# Altium footprint library Vowstar_Basic_Device.PcbLib: 170 footprints (part 6 of 11)
Each footprint in its own frame and in the unit in brackets; x right, y up, seen from the top. Pads: shape width x height; smd on the part's side, far side on the other; paste and mask are expansions set on the pad; w line width, h text height; cw(c..) or ccw(c..) is an arc to the next point about the centre after c.
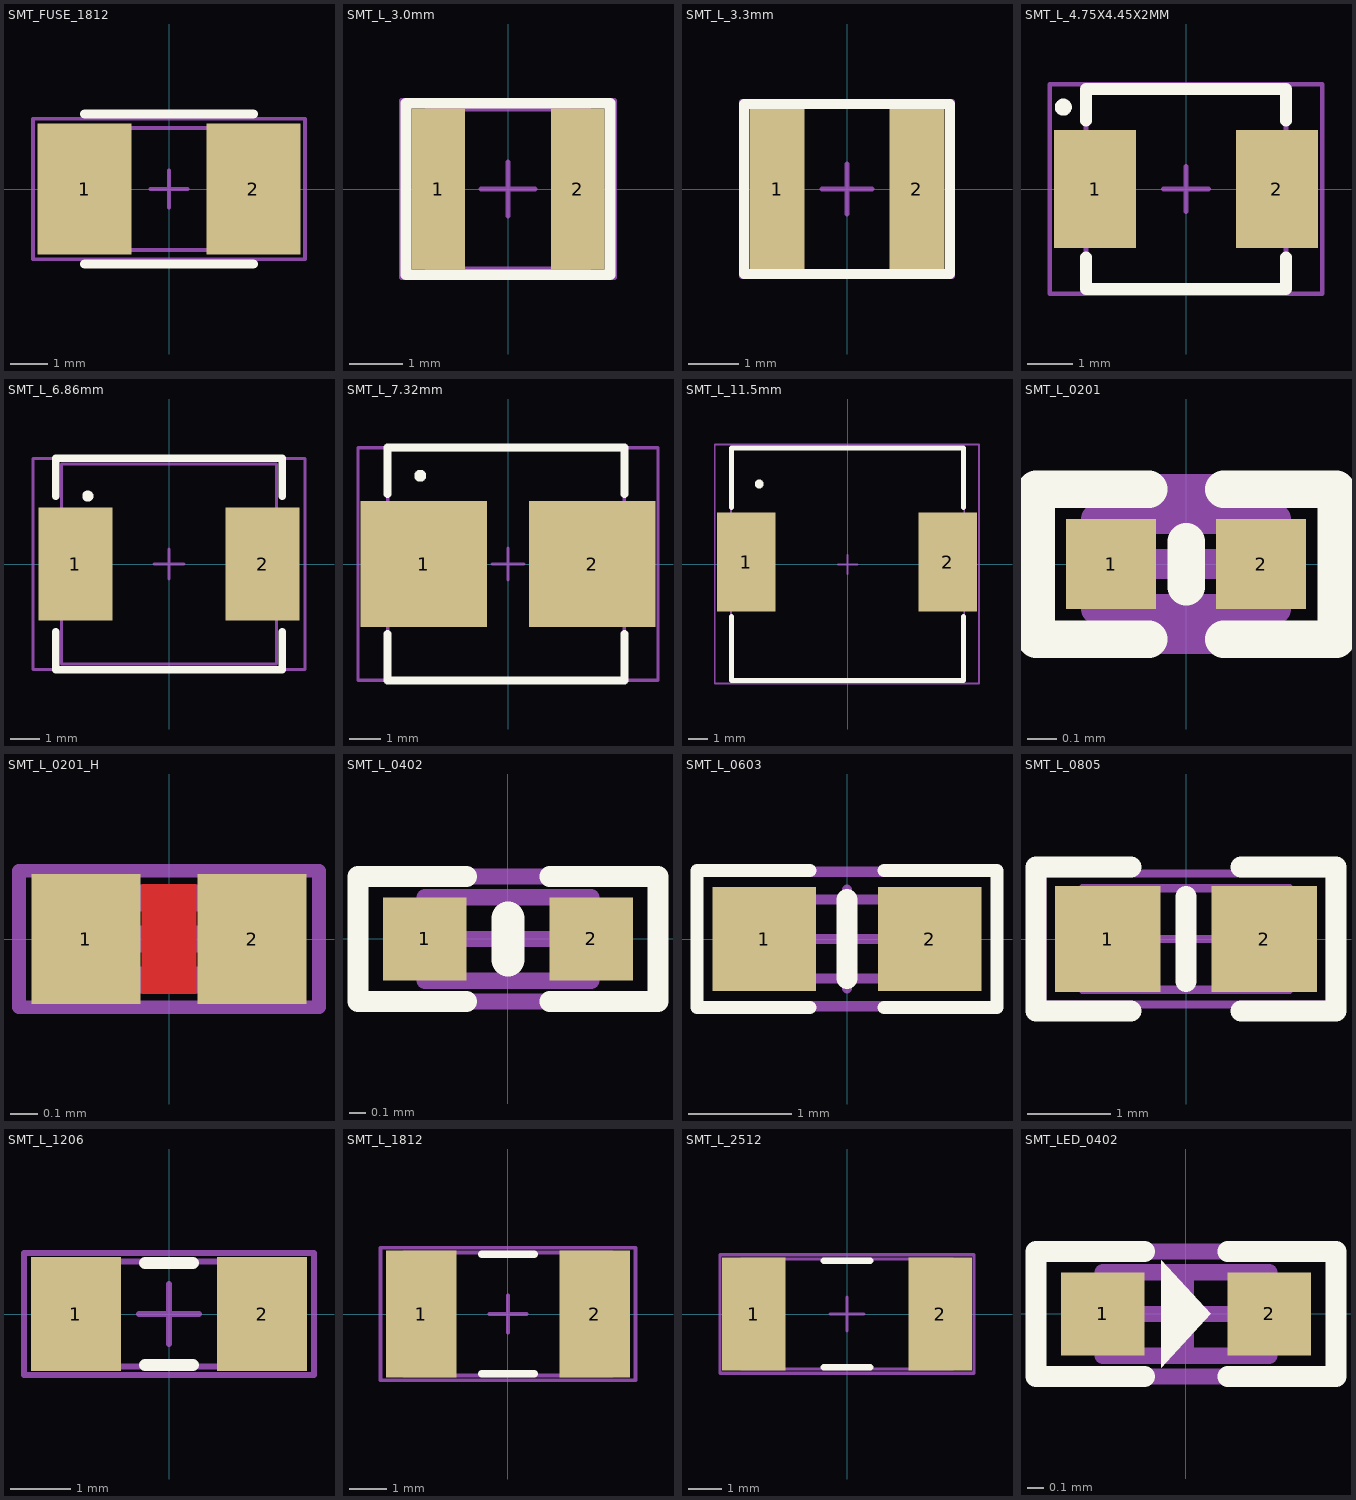
[diagram p5: the footprints below, top view; thin cyan lines are the x and y axes]

## SMT_FUSE_1812 [mil] "Surface mount FUSE 1812"
pads (2):
  rect 100x140 smd: 1(-90,0) 2(90,0)
Top Overlay:
  lines w10: -90,-80 90,-80 ; -90,80 90,80
Mechanical 13:
  lines w3.94: -95,-65 95,-65 95,65 -95,65 -95,-65
Mechanical 15:
  lines w3.94: -19.69,0 19.68,0 ; 0,-19.68 0,19.69 ; -145,-75 -145,75 145,75 145,-75 -145,-75
3D body "User Library-FUSE-1812-GOLDEN.step": height 51.97, standoff 0, extent -94.88,-63.38 94.89,63.39

## SMT_L_3.0mm [mm] "SMT Power Inductor, 3.0x3.0x1mm"
height 1
pads (2):
  rect 1x3 smd: 1(-1.3,0) 2(1.3,0)
Top Overlay:
  lines w0.2: -1.905,-1.6 1.905,-1.6 1.905,1.6 -1.905,1.6 -1.905,-1.6
Mechanical 13:
  lines w0.1: -1.5,-1.5 1.5,-1.5 1.5,1.5 -1.5,1.5 -1.5,-1.5
Mechanical 15:
  lines w0.1: -0.5,0 0.5,0 ; 0,-0.5 0,0.5 ; -1.981,-1.651 1.981,-1.651 1.981,1.651 -1.981,1.651 -1.981,-1.651
3D body "Inductor SMD 3x3 semi-shielded 3D.STEP": height 1.04, standoff -0.01, extent -1.503,-1.5 1.503,1.5

## SMT_L_3.3mm [mm] "LPO3310 SMT Power Inductor, 3.3x3.3x1mm"
height 1
pads (2):
  rect 1.1x3.2 smd: 1(-1.4,0) 2(1.4,0)
Top Overlay:
  lines w0.2: -2.057,-1.702 2.057,-1.702 2.057,1.702 -2.057,1.702 -2.057,-1.702
Mechanical 13:
  lines w0.1: -1.651,-1.651 1.651,-1.651 1.651,1.651 -1.651,1.651 -1.651,-1.651
Mechanical 15:
  lines w0.1: -0.5,0 0.5,0 ; 0,-0.5 0,0.5 ; -2.108,-1.753 2.108,-1.753 2.108,1.753 -2.108,1.753 -2.108,-1.753
3D body "Inductor SMD 3.3x3.3 semi-shielded 3D.STEP": height 1.06, standoff -0.1, extent -1.654,-1.65 1.653,1.65

## SMT_L_4.75X4.45X2MM [mm] "SMT Power Inductor,4.75x4.45x2mm, FXL0420-4R7-M"
height 2
pads (2):
  rect 1.8x2.6 smd: 1(-2,0) 2(2,0)
Top Overlay:
  circle w0.254: c-2.7,1.8 r0.06
  lines w0.254: -2.2,-1.5 -2.2,-2.2 2.2,-2.2 2.2,-1.5 ; -2.2,1.5 -2.2,2.2 2.2,2.2 2.2,1.5
Mechanical 13:
  lines w0.1: -2.2,-2.2 -2.2,2.2 2.2,2.2 2.2,-2.2 -2.2,-2.2
Mechanical 15:
  lines w0.1: -0.5,0 0.5,0 ; 0,-0.5 0,0.5 ; -3,-2.3 3,-2.3 3,2.3 -3,2.3 -3,-2.3
3D body "FXL0420-4R7-M.STEP": height 2.1, standoff 0, extent -2.575,-2.225 2.575,2.225

## SMT_L_6.86mm [mm] "Vishay IHLP2525,SMT Power Inductor,6.86x6.86x3mm"
height 3
pads (2):
  rect 2.5x3.8 smd: 1(-3.151,0) 2(3.151,0)
Top Overlay:
  circle w0.254: c-2.734,2.286 r0.06
  lines w0.254: -3.81,-2.286 -3.81,-3.556 3.81,-3.556 3.81,-2.286 ; -3.81,2.286 -3.81,3.556 3.81,3.556 3.81,2.286
Mechanical 13:
  lines w0.1: -3.621,-3.362 -3.621,3.362 3.621,3.362 3.621,-3.362 -3.621,-3.362
Mechanical 15:
  lines w0.1: -0.5,0 0.5,0 ; 0,-0.5 0,0.5 ; -4.572,-3.556 4.572,-3.556 4.572,3.556 -4.572,3.556 -4.572,-3.556
3D body: height 1, standoff 0, extent -3.81,-1.905 -1.905,1.905
3D body: height 1, standoff 0, extent 1.905,-1.905 3.81,1.905
3D body: height 3, standoff 0, extent -3.683,-3.429 3.683,3.429

## SMT_L_7.32mm [mm] "Power Inductor, 7.32x7.32x4mm"
height 4
pads (2):
  rect 4x4 smd: 1(-2.667,0) 2(2.667,0)
Top Overlay:
  circle w0.254: c-2.778,2.794 r0.06
  lines w0.254: -3.81,-2.222 -3.81,-3.683 3.683,-3.683 3.683,-2.222 ; -3.81,2.222 -3.81,3.683 3.683,3.683 3.683,2.222
Mechanical 13:
  lines w0.1: -3.81,-3.683 3.683,-3.683 3.683,3.607 -3.81,3.607 -3.81,-3.683
Mechanical 15:
  lines w0.1: -0.5,0 0.5,0 ; 0,-0.5 0,0.5 ; -4.75,-3.683 -4.75,3.683 4.75,3.683 4.75,-3.683 -4.75,-3.683
3D body: height 4, standoff 0, extent -3.81,-3.683 3.683,3.683

## SMT_L_11.5mm [mil] "Vishay HLP4040 SMT Inductor,11.5x11.5x4mm"
height 157.48
pads (2):
  rect 118.11x200 smd: 1(-205,5) 2(202.5,5)
Top Overlay:
  circle w10: c-178.98,163 r4.02
  lines w10: -235,-105 -235,-235 235,-235 235,-105 ; -235,115 -235,236 235,236 235,115
Mechanical 13:
  lines w3.94: -236.22,-236.22 236.22,-236.22 236.22,236.22 -236.22,236.22 -236.22,-236.22
Mechanical 15:
  lines w3.94: -19.69,0 19.68,0 ; 0,-19.68 0,19.69 ; -269,-241 -269,243 266,243 266,-241 -269,-241
3D body: height 157.48, standoff 0, extent -236,-235 235,236

## SMT_L_0201 [mil] "Surface mount inductor 0201"
height 11.81
pads (2):
  rect 12x12 smd: 1(-10,0) 2(10,0)
Top Overlay:
  lines w5: -5,-10 -20,-10 -20,10 -5,10 ; 0,-3 0,3 ; 5,-10 20,-10 20,10 5,10
Mechanical 13:
  lines w3.94: -12,-6 12,-6 12,6 -12,6 -12,-6
Mechanical 15:
  lines w3.94: -5,0 5,0 ; 0,-5 0,5 ; -20,-10 20,-10 20,10 -20,10 -20,-10
3D body "User Library-0201(0603M) Res.step": height 12.1, standoff 0, extent -11.99,-5.99 12.01,6.01

## SMT_L_0201_H [mm] "Chip Inductor, 2-Leads, Body 0.60x0.30mm, IPC High Density"
height 0.2
pads (2):
  rect 0.4x0.475 smd paste-1 mask-1: 1(-0.305,0) 2(0.305,0)
Top Layer:
  pour cut-out: -0.1,0.2 -0.1,-0.2 0.1,-0.2 0.1,0.2
Top Paste:
  rectangle: -0.43,-0.162 -0.105,0.162
  region: 0.43,0.163 0.105,0.163 0.105,-0.162 0.43,-0.162
Top Solder:
  rectangle: -0.43,-0.163 0.43,0.162
Mechanical 13:
  lines w0.1: -0.3,-0.15 0.3,-0.15 0.3,0.15 -0.3,0.15 -0.3,-0.15
Mechanical 15:
  lines w0.05: -0.55,-0.25 0.55,-0.25 0.55,0.25 -0.55,0.25 -0.55,-0.25
  lines w0.1: -0.15,0 0.15,0 ; 0,-0.15 0,0.15
3D body "User Library-0201(0603M) Res.step": height 0.31, standoff 0, extent -0.305,-0.152 0.305,0.153

## SMT_L_0402 [mil] "Surface mount inductor 0402"
height 11.81
pads (2):
  rect 20x20 smd: 1(-20,0) 2(20,0)
Top Overlay:
  lines w5: -10,-15 -36,-15 -36,15 -10,15 ; 10,-15 36,-15 36,15 10,15
  lines w8: 0,-5 0,5
Mechanical 13:
  lines w3.94: -20,-10 20,-10 20,10 -20,10 -20,-10
Mechanical 15:
  lines w3.94: -10,0 10,0 ; 0,-10 0,10 ; -36,-15 36,-15 36,15 -36,15 -36,-15
3D body "User Library-0402(1005M) Res.step": height 20.1, standoff 0, extent -20,-10 20,10

## SMT_L_0603 [mm] "Surface mount inductor 0603"
height 0.85
pads (2):
  rect 1x1 smd: 1(-0.8,0) 2(0.8,0)
Top Overlay:
  lines w0.127: -0.356,-0.66 -1.448,-0.66 -1.448,0.66 -0.356,0.66 ; 0.356,-0.66 1.448,-0.66 1.448,0.66 0.356,0.66
  lines w0.203: 0,-0.381 0,0.381
Mechanical 13:
  lines w0.1: -1.016,-0.381 -1.016,0.381 1.016,0.381 1.016,-0.381 -1.016,-0.381
Mechanical 15:
  lines w0.1: -0.475,0 0.475,0 ; 0,-0.475 0,0.475 ; -1.448,-0.65 -1.448,0.65 1.448,0.65 1.448,-0.65 -1.448,-0.65
3D body "User Library-0603(1608M) Res.step": height 0.79, standoff 0, extent -1.016,-0.381 0.984,0.406

## SMT_L_0805 [mil] "Surface mount inductor 0805"
height 70
pads (2):
  rect 50x50 smd: 1(-37,0) 2(37,0)
Top Overlay:
  lines w10: -26,-34 -71,-34 -71,34 -26,34 ; 0,-20 0,20 ; 26,-34 71,-34 71,34 26,34
Mechanical 13:
  lines w3.94: -49,-24 -49,24 49,24 49,-24 -49,-24
Mechanical 15:
  lines w3.94: -19.68,0 19.69,0 ; 0,-19.69 0,19.68 ; -68,-31 68,-31 68,31 -68,31 -68,-31
3D body "User Library-0805(2012M) Res.step": height 31.1, standoff 0, extent -49.37,-24.5 49.38,24.5

## SMT_L_1206 [mm] "Surface mount inductor 1206"
height 0.71
pads (2):
  rect 1.5x1.9 smd: 1(-1.55,0) 2(1.55,0)
Top Overlay:
  lines w0.2: -0.4,-0.85 0.4,-0.85 ; -0.4,0.85 0.4,0.85
Mechanical 13:
  lines w0.1: -1.675,-0.875 -1.675,0.875 1.675,0.875 1.675,-0.875 -1.675,-0.875
Mechanical 15:
  lines w0.1: -0.5,0 0.5,0 ; 0,-0.5 0,0.5 ; -2.413,-1.016 -2.413,1.016 2.413,1.016 2.413,-1.016 -2.413,-1.016
3D body "User Library-1206(3216M) Res.step": height 1.53, standoff 0, extent -2,-0.8 2,0.8

## SMT_L_1812 [mm] "Surface mount inductor 1812"
height 1.7
pads (2):
  rect 1.9x3.4 smd: 1(-2.331,0) 2(2.331,0)
Top Overlay:
  lines w0.2: -0.7,-1.6 0.7,-1.6 ; -0.7,1.6 0.7,1.6
Mechanical 13:
  lines w0.1: -2.794,-1.651 2.794,-1.651 2.794,1.651 -2.794,1.651 -2.794,-1.651
Mechanical 15:
  lines w0.1: -0.5,0 0.5,0 ; 0,-0.5 0,0.5 ; -3.429,-1.778 3.429,-1.778 3.429,1.778 -3.429,1.778 -3.429,-1.778
3D body "User Library-1812(4532M) Res.step": height 2.54, standoff 0, extent -2.81,-1.6 2.81,1.6

## SMT_L_2512 [mm] "Surface mount inductor 2512"
height 1.7
pads (2):
  rect 1.9x3.4 smd: 1(-2.8,0) 2(2.8,0)
Top Overlay:
  lines w0.2: -0.7,-1.6 0.7,-1.6 ; -0.7,1.6 0.7,1.6
Mechanical 13:
  lines w0.1: -3.175,-1.651 3.175,-1.651 3.175,1.651 -3.175,1.651 -3.175,-1.651
Mechanical 15:
  lines w0.1: -0.5,0 0.5,0 ; 0,-0.5 0,0.5 ; -3.81,-1.778 3.81,-1.778 3.81,1.778 -3.81,1.778 -3.81,-1.778
3D body "User Library-2512(6432M) Res.step": height 0.6, standoff 0, extent -3.2,-1.6 3.2,1.6

## SMT_LED_0402 [mil] "Surface mount LED 0402"
height 11.81
pads (2):
  rect 20x20 smd: 1(-20,0) 2(20,0)
Top Overlay:
  region: -6,12.88 6,0 -6,-12.88
  lines w5: -10,-15 -36,-15 -36,15 -10,15 ; 10,-15 36,-15 36,15 10,15
Mechanical 13:
  lines w3.94: -20,-10 20,-10 20,10 -20,10 -20,-10
Mechanical 15:
  lines w3.94: -10,0 10,0 ; 0,-10 0,10 ; -36,-15 36,-15 36,15 -36,15 -36,-15
3D body "User Library-0402(1005M) LED.step": height 17.72, standoff 0, extent -19.88,-9.84 19.89,9.85